# Altium footprint library pw.PcbLib: 210 footprints (part 2 of 14)
Each footprint in its own frame and in the unit in brackets; x right, y up, seen from the top. Pads: shape width x height; smd on the part's side, far side on the other; paste and mask are expansions set on the pad; w line width, h text height; cw(c..) or ccw(c..) is an arc to the next point about the centre after c.
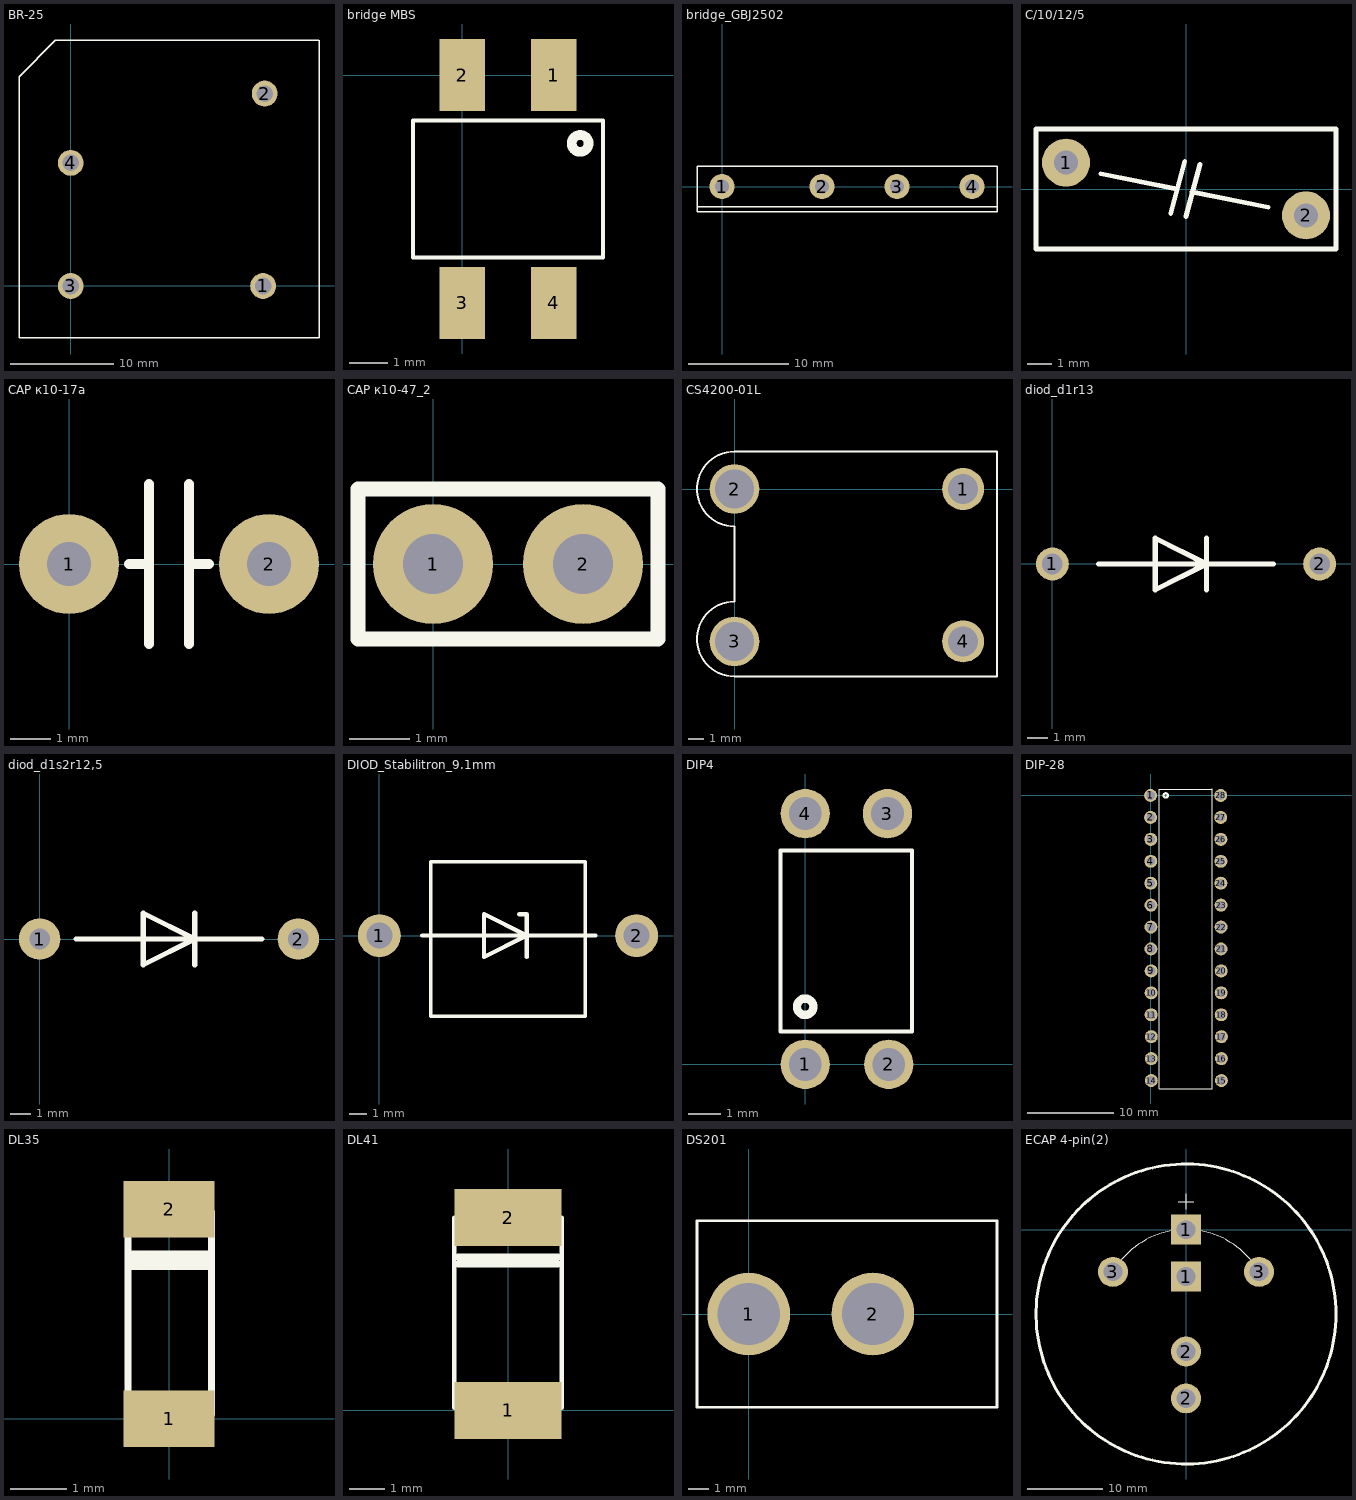
[diagram p1: the footprints below, top view; thin cyan lines are the x and y axes]

## BR-25 [mm] "KBPC"
pads (4):
  round 2.5 hole 1.6: 1(18.6,0) 2(18.75,18.6) 3(0,0) 4(0,11.9)
Top Overlay:
  lines w0.125: -5,-5 -5,20.25 -1.5,23.75 24,23.75 24,-5 -5,-5
3D body "User Library-Bridge KBPC 5012 F.STEP": height 7.5, standoff -14.5, extent -4.9,-5 23.7,23.6

## bridge MBS [mm]
pads (4):
  rect 1.2x1.9 smd: 1(2.4,0) 2(0,0) 3(0,-6) 4(2.4,-6)
Top Overlay:
  circle w0.254: c3.1,-1.8 r0.224
  lines w0.1: -1.3,-4.8 3.7,-4.8 3.7,-1.2 -1.3,-1.2 -1.3,-4.8
3D body "User Library-SO4.STEP": height 2.18, standoff 0, extent -0.85,-6.14 3.25,-0.06

## bridge_GBJ2502 [mm]
pads (4):
  round 2.5 hole 1.4: 1(0,0) 2(10,0) 3(17.5,0) 4(25,0)
Top Overlay:
  lines w0.125: -2.5,-2 27.5,-2 ; -2.5,-2.5 -2.5,2 27.5,2 27.5,-2.5 -2.5,-2.5
3D body "User Library-KBJ-GSIB.STEP": height 26.25, standoff -12.71, extent -2.498,-2.25 27.498,2.55

## C/10/12/5 [mm]
pads (2):
  round 2 hole 1: 1(-5,1.1) 2(5,-1.1)
Top Overlay:
  lines w0.2: -3.556,0.635 -0.381,0 ; -0.635,-1.016 -0.055,1.151 ; 0,-1.143 0.58,1.024 ; 0.254,-0.127 3.429,-0.762 ; -6.25,-2.5 -6.25,2.5 6.25,2.5 6.25,-2.5 -6.25,-2.5

## CAP к10-17а [mm]
pads (2):
  round 2.5 hole 1.1: 1(0,0) 2(5,0)
Top Overlay:
  lines w0.254: 1.5,0 2,0 ; 2,-2 2,2 ; 3,-2 3,2 ; 3,0 3.5,0

## CAP к10-47_2 [mm]
pads (2):
  round 2 hole 1: 1(0,0) 2(2.5,0)
Top Overlay:
  lines w0.254: -1.25,-1.25 3.75,-1.25 3.75,1.25 -1.25,1.25 -1.25,-1.25

## CS4200-01L [mm] "трансформатор тока"
pads (4):
  round 2.8 hole 2: 1(15.24,0) 4(15.24,-10.16)
  round 3.3 hole 2.6: 2(0,0) 3(0,-10.16)
Top Overlay:
  lines w0.125: 0,-12.5 cw(c0,-10) 0,-7.5 0,-2.5 cw(c0,0) 0,2.5 17.5,2.5 17.5,-12.5 0,-12.5
3D body "Coilcraft-CS4xx0V-AL.STEP": height 19.05, standoff -4.57, extent -2.03,-12.24 17.53,2.24

## diod_d1r13 [mm]
pads (2):
  round 1.6 hole 1: 1(0,0) 2(13,0)
Top Overlay:
  lines w0.254: 2.25,0 10.75,0 ; 7.5,-1.25 7.5,1.25 ; 5,-1.25 7.5,0 5,1.25 5,-1.25

## diod_d1s2r12,5 [mm] "2Д522"
pads (2):
  round 2 hole 1: 1(0,0) 2(12.5,0)
Top Overlay:
  lines w0.254: 1.75,0 10.75,0 ; 7.5,-1.25 7.5,1.25 ; 5,-1.25 7.5,0 5,1.25 5,-1.25
3D body "DO-41_12.8.STEP": height 2.75, standoff -1.2, extent -0.652,-1.255 12.84,1.255

## DIOD_Stabilitron_9.1mm [mm]
pads (2):
  round 2.5 hole 1.5: 1(0,0) 2(15,0)
Top Overlay:
  lines w0.2: 3,-4.7 12,-4.7 12,-0.2 12,4.3 3,4.3 3,-0.2 3,-4.7
  lines w0.254: 2.5,0 12.6,0 ; 8.15,1.25 8.6,1.25 8.6,-1.25 ; 6.1,-1.25 8.6,0 6.1,1.25 6.1,-1.25
3D body "User Library-Diode R-6 diameter 9_1 pitch 600mils.step": height 9.56, standoff -5.15, extent -0.74,-4.7 15.8,4.42

## DIP4 [mm]
pads (4):
  round 1.5 hole 1: 1(0,0) 2(2.54,0) 3(2.5,7.62) 4(0,7.62)
Top Overlay:
  circle w0.254: c0,1.75 r0.25
  lines w0.125: -0.75,1 -0.75,6.5 3.25,6.5 3.25,1 -0.75,1
3D body "User Library-DIP-4.STEP": height 5.3, standoff -2, extent -1.04,-0.25 3.54,7.62

## DIP-28 [mm] "atmega"
pads (28):
  round 1.5 hole 1: 1(-0.02,0) 2(-0.02,-2.54) 3(0,-5.08) 4(0,-7.62) 5(0,-10.16) 6(0.02,-12.7) 7(0.02,-15.24) 8(0.02,-17.78) 9(0.04,-20.32) 10(0.04,-22.86) 11(0.04,-25.4) 12(0.06,-27.94) 13(0.06,-30.48) 14(0.06,-33.02) 15(8.18,-33.02) 16(8.18,-30.48) 17(8.18,-27.94) 18(8.16,-25.4) 19(8.16,-22.86) 20(8.16,-20.32) 21(8.14,-17.78) 22(8.14,-15.24) 23(8.14,-12.7) 24(8.12,-10.16) 25(8.12,-7.62) 26(8.12,-5.08) 27(8.1,-2.54) 28(8.1,0)
Top Overlay:
  circle w0.254: c1.73,0 r0.25
  lines w0.125: 0.98,-34 7.1,-34 7.1,0.75 0.98,0.75 0.98,-34
3D body "User Library-User Library-ATmega 48_88_168_328 28P3_90DEG.STEP": height 5.04, standoff -2.08, extent 0.147,-33.925 8.053,0.725

## DL35 [mm] "диод, стабилитрон"
pads (2):
  rect 1.6x1 smd: 1(0,0) 2(0,3.7)
Top Overlay:
  lines w0.125: -0.725,0.075 0.75,0.075 0.75,3.65 -0.725,3.65 -0.725,0.075
  lines w0.2: -0.65,2.725 0.7,2.725 ; -0.65,2.875 0.7,2.875

## DL41 [mm]
pads (2):
  rect 3x1.6 smd: 1(0,0) 2(0,5.4)
Top Overlay:
  lines w0.125: -1.5,0.075 -1.5,5.4 1.5,5.4 1.5,0.075 -1.5,0.075
  lines w0.2: -1.4,4.1 1.4,4.1 ; -1.4,4.3 1.4,4.3
3D body "User Library-DL-41.STEP": height 2.4, standoff 0, extent -1.2,0.2 1.2,5.2

## DS201 [mm] "гнездо 2.1/5.5 на плату"
pads (2):
  round 4 hole 3: 1(0,0) 2(6,0)
Top Overlay:
  lines w0.125: -2.5,-4.5 -2.5,4.5 12,4.5 12,-4.5 -2.5,-4.5
3D body "User Library-PJ-002AH.STEP": height 11.05, standoff -3.45, extent -0.95,-4.75 13.45,4.65

## ECAP 4-pin(2) [mm]
height 80
pads (6):
  rect 4x4 hole 2.5: 1(0,-6.25) 1(0,0)
  round 4 hole 2.5: 2(0,-22.5) 2(0,-16.25) 3(-9.743,-5.625) 3(9.743,-5.625)
Top Overlay:
  circle w0.4: c0,-11.25 r20
  lines w0.1: -9.743,-5.625 cw(c0,-11.25) 0,0 cw(c0,-11.25) 9.743,-5.625
  lines w0.125: -1,3.75 1,3.75 ; 0,2.75 0,4.75
3D body "User Library-Assy_CE_R400_D1200_H2000.STEP": height 50.8, standoff -6.89, extent -15.25,-26.73 15.229,3.75